# Altium integrated library Transistor-SMD_V2.IntLib: 415 symbols (part 1 of 2)
Pins are listed as number, name and electrical type; pins without a type are passive.

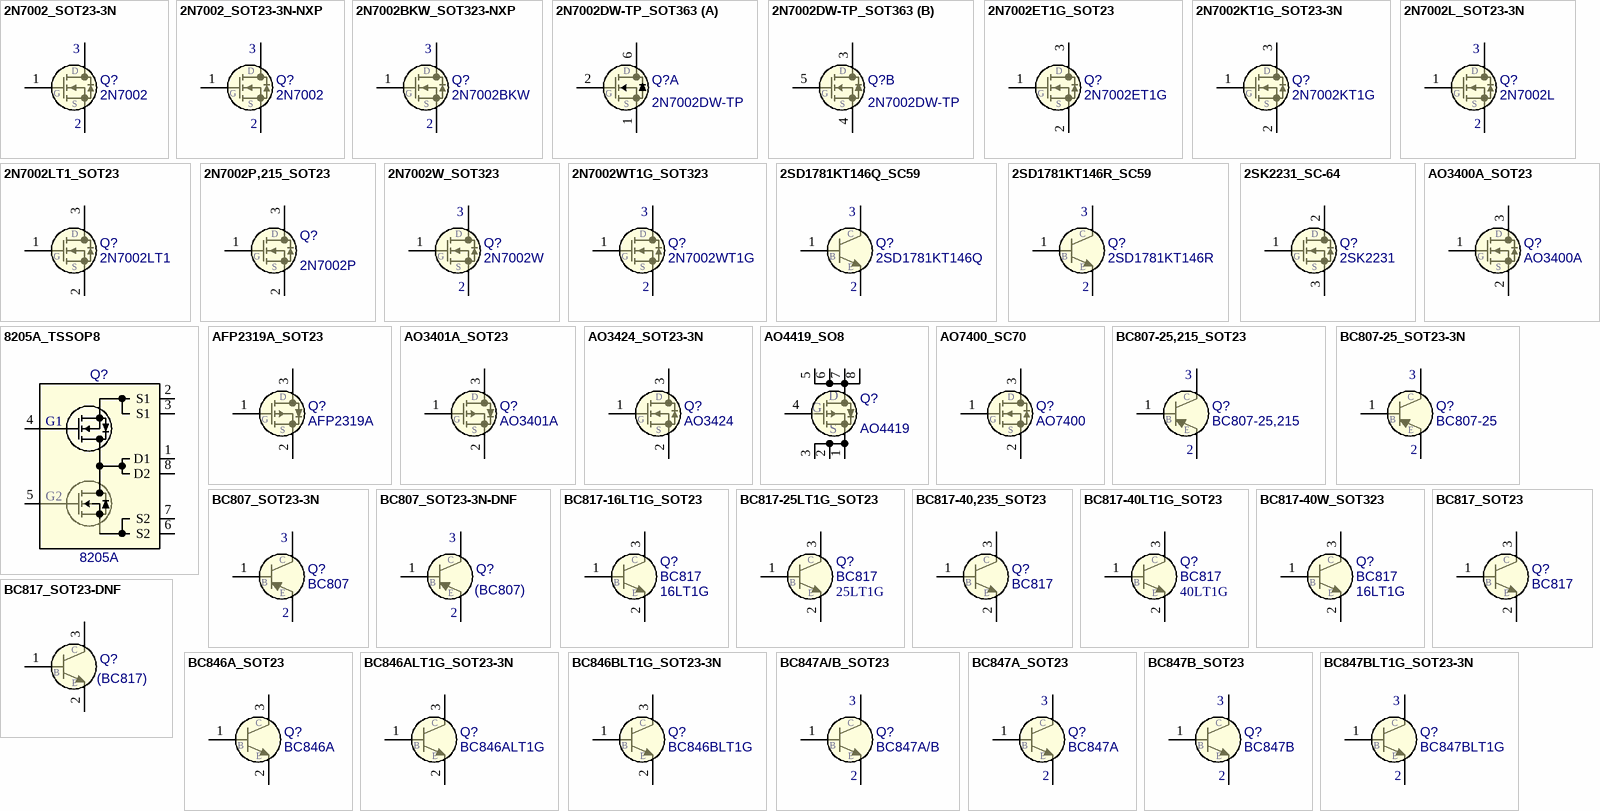
[diagram p0: symbols 2N7002_SOT23-3N to BC847BLT1G_SOT23-3N]

## 2N7002_SOT23-3N
designator Q?, comment 2N7002
FET N-Channel 60V 115mA; Manufacturer: On Semi; EDM-PN: FET12; Package: SOT23; Text2: *; Text1: *; Value: 2N7002; SAAB PN: *; DCE Part No: *; Part Number: 2N7002
footprint SOT23 (SOT23, 3-Leads, Body 3.0x1.4mm (max), Pitch 0.95mm, IPC Medium Density)
pins: 1 G, 2 S, 3 D

## 2N7002_SOT23-3N-NXP
designator Q?, comment Part Number: 2N7002  (hidden comment: 2N7002-NXP)
FET N-Channel 60V 300mA; Manufacturer: NXP; Value: 2N7002; Package: SOT23; EDM-PN: *; Text2: *; Text1: *; SAAB PN: *; DCE Part No: *
footprint SOT23 (SOT23, 3-Leads, Body 3.0x1.4mm (max), Pitch 0.95mm, IPC Medium Density)
pins: 1 G, 2 S, 3 D

## 2N7002BKW_SOT323-NXP
designator Q?, comment 2N7002BKW
FET N-Channel 60V 310mA; Manufacturer: NXP; Package: SOT323; EDM-PN: *; Text2: *; Text1: *; Value: 2N7002BKW; SAAB PN: *; DCE Part No: *; Part Number: 2N7002BKW
footprint SOT323 (SOT323 2.2x1.3mm)
pins: 1 G, 2 S, 3 D

## 2N7002DW-TP_SOT363
designator Q?, comment 2N7002DW-TP
FET Dual N-Channel 60V 115mA; Manufacturer: MCS; Package: SOT363-6; EDM-PN: *; Text2: *; Text1: *; Part Number: 2N7002DW-TP; SAAB PN: *; DCE Part No: *; Value: 2N7002DW-TP
footprint SOT363-6 (SOT363 1.35x2.2mm 6lead)
part A pins: 1 S1, 2 G1, 6 D1
part B pins: 3 D2, 4 S2, 5 G2
part A text: D; G; S
part B text: D; G; S

## 2N7002ET1G_SOT23
designator Q?, comment 2N7002ET1G
FET N-Channel 60V 260mA; Manufacturer: On Semi; Package: SOT23; EDM-PN: *; Text2: *; Text1: *; Value: 2N7002ET1G; SAAB PN: *; Part Number: 2N7002ET1G; DCE Part No: *
footprint SOT23 (SOT23, 3-Leads, Body 3.0x1.4mm (max), Pitch 0.95mm, IPC Medium Density)
pins: 1 G, 2 S, 3 D

## 2N7002KT1G_SOT23-3N
designator Q?, comment 2N7002KT1G
FET N-Channel 60V 380mA; Manufacturer: On Semi; DCE Part No: 8093; Package: SOT23; EDM-PN: *; Text2: *; Text1: *; Value: 2N7002KT1G; SAAB PN: *; Part Number: 2N7002KT1G
footprint SOT23 (SOT23, 3-Leads, Body 3.0x1.4mm (max), Pitch 0.95mm, IPC Medium Density)
pins: 1 G, 2 S, 3 D

## 2N7002L_SOT23-3N
designator Q?, comment 2N7002L
FET N-Channel 60V 115mA; Manufacturer: On Semi; Package: SOT23; EDM-PN: *; Text2: *; Text1: *; Value: 2N7002L; SAAB PN: *; DCE Part No: *; Part Number: 2N7002L
footprint SOT23 (SOT23, 3-Leads, Body 3.0x1.4mm (max), Pitch 0.95mm, IPC Medium Density)
pins: 1 G, 2 S, 3 D

## 2N7002LT1_SOT23
designator Q?, comment 2N7002LT1
FET N-Channel 60V 115mA; Manufacturer: On Semi; EDM-PN: FET12; Package: SOT23; Text2: *; Text1: *; Value: 2N7002LT1; SAAB PN: *; DCE Part No: *; Part Number: 2N7002LT1
footprint SOT23 (SOT23, 3-Leads, Body 3.0x1.4mm (max), Pitch 0.95mm, IPC Medium Density)
pins: 1 G, 2 S, 3 D

## 2N7002P,215_SOT23
designator Q?, comment value 2N7002P  (hidden comment: 2N7002P,215)
FET N-Channel 60V 115mA; Manufacturer: On Semi; Package: SOT23; EDM-PN: *; Text2: *; Text1: *; SAAB PN: *; DCE Part No: *; Part Number: 2N7002P,215
footprint SOT23 (SOT23, 3-Leads, Body 3.0x1.4mm (max), Pitch 0.95mm, IPC Medium Density)
pins: 1 G, 2 S, 3 D

## 2N7002W_SOT323
designator Q?, comment 2N7002W
FET N-Channel 60V 115mA; Manufacturer: Fairchild; DCE Part No: 8093; EDM-PN: FET114; Package: SOT323; Text2: *; Text1: *; Value: 2N7002W; SAAB PN: *; Part Number: 2N7002W
footprint SOT323 (SOT323 2.2x1.3mm)
pins: 1 G, 2 S, 3 D

## 2N7002WT1G_SOT323
designator Q?, comment 2N7002WT1G
FET N-Channel 60V 115mA; Manufacturer: On Semi; DCE Part No: 8093; EDM-PN: FET114; Package: SOT323; Text2: *; Text1: *; Value: 2N7002WT1G; SAAB PN: *; Part Number: 2N7002WT1G
footprint SOT323 (SOT323 2.2x1.3mm)
pins: 1 G, 2 S, 3 D

## 2SD1781KT146Q_SC59
designator Q?, comment 2SD1781KT146Q
Transistor NPN 32V 800mA; Manufacturer: Rohm; Package: SC59; EDM-PN: *; Text2: *; Text1: *; Value: 2SD1781KT146Q; SAAB PN: *; DCE Part No: *; Part Number: 2SD1781KT146Q
footprint SC59 (SC59 1.7x3.1mm)
pins: 1 B, 2 E, 3 C

## 2SD1781KT146R_SC59
designator Q?, comment 2SD1781KT146R
Transistor NPN 32V 800mA; Manufacturer: Rohm; Package: SC59; EDM-PN: *; Text2: *; Text1: *; Value: 2SD1781KT146R; SAAB PN: *; Part Number: 2SD1781KT146R; DCE Part No: *
footprint SC59 (SC59 1.7x3.1mm)
pins: 1 B, 2 E, 3 C

## 2SK2231_SC-64
designator Q?, comment 2SK2231
FET N-Channel 100V 100mA; Manufacturer: Toshiba; Package: SC64; EDM-PN: *; Text2: *; Text1: *; Value: 2SK2231; SAAB PN: *; DCE Part No: *; Part Number: 2SK2231
footprint SC64 (SC64 6.8x7.5mm)
pins: 1 G, 2 S, 3 D

## 8205A_TSSOP8
designator Q?, comment 8205A
FET Dual N-Channel 20V 5A; Manufacturer: Hottech; Package: TSSOP-8; EDM-PN: *; Text2: *; Text1: *; Value: 8205A; SAAB PN: *; Part Number: 8205A; DCE Part No: *
footprint TSSOP8-3.1x4.5 (TSSOP, 8-Leads, Body 3.1x4.5mm (max), Pitch 0.65mm, IPC Medium Density)
pins: 1 D1, 2 S1, 3 S1, 4 G1, 5 G2, 6 S2, 7 S2, 8 D2

## AFP2319A_SOT23
designator Q?, comment AFP2319A
FET P-Channel 40V 2.4A; Manufacturer: Alfa-MOS Tech; Package: SOT23; EDM-PN: *; Text2: *; Text1: *; Value: AFP2319A; SAAB PN: *; Part Number: AFP2319A; DCE Part No: *
footprint SOT23 (SOT23, 3-Leads, Body 3.0x1.4mm (max), Pitch 0.95mm, IPC Medium Density)
pins: 1 G, 2 S, 3 D

## AO3400A_SOT23
designator Q?, comment AO3400A
FET N-Channel 30V 5.7A; Manufacturer: Alpha & Omega; Package: SOT23; EDM-PN: *; Text2: *; Text1: *; Value: AO3400A; SAAB PN: *; Part Number: AO3400A; DCE Part No: *
footprint SOT23 (SOT23, 3-Leads, Body 3.0x1.4mm (max), Pitch 0.95mm, IPC Medium Density)
pins: 1 G, 2 S, 3 D

## AO3401A_SOT23
designator Q?, comment AO3401A
FET P-Channel 30V 4A; Manufacturer: Alpha & Omega; Package: SOT23; EDM-PN: *; Text2: *; Text1: *; Value: AO3401A; SAAB PN: *; Part Number: AO3401A; DCE Part No: *
footprint SOT23 (SOT23, 3-Leads, Body 3.0x1.4mm (max), Pitch 0.95mm, IPC Medium Density)
pins: 1 G, 2 S, 3 D

## AO3424_SOT23-3N
designator Q?, comment AO3424
FET N-Channel 30V 3.8A; Manufacturer: Alpha & Omega; Package: SOT23; EDM-PN: *; Text2: *; Text1: *; Value: AO3424; SAAB PN: *; Part Number: AO3424; DCE Part No: *
footprint SOT23 (SOT23, 3-Leads, Body 3.0x1.4mm (max), Pitch 0.95mm, IPC Medium Density)
pins: 1 G, 2 S, 3 D

## AO4419_SO8
designator Q?, comment AO4419
FET P-Channel 30V 9.7A; Manufacturer: Alpha & Omega; Package: SO8; EDM-PN: *; Text2: *; Text1: *; Value: AO4419; SAAB PN: *; Part Number: AO4419; DCE Part No: *
footprint SO8 (SOIC, 8-Leads, Body 5.0x4.0mm (max), Pitch 1.27mm, IPC Medium Density)
pins: 1 S, 2 S, 3 S, 4 G, 5 D, 6 D, 7 D, 8 D

## AO7400_SC70
designator Q?, comment AO7400
FET N-Channel 1A 20V; Manufacturer: Alpha & Omega; Package: SC70-3; EDM-PN: *; Text2: *; Text1: *; Value: AO7400; SAAB PN: *; DCE Part No: *; Part Number: AO7400
footprint SC70-3 (SC70-3 2.1x1.24mm)
pins: 1 G, 2 S, 3 D

## BC807-25,215_SOT23
designator Q?, comment BC807-25,215
Transistor PNP General Purpose 45V 500mA; Manufacturer: Nexperia; Package: SOT23; EDM-PN: *; Text2: *; Text1: *; Value: BC807-25,215; SAAB PN: *; DCE Part No: *; Part Number: BC807-25,215
footprint SOT23 (SOT23, 3-Leads, Body 3.0x1.4mm (max), Pitch 0.95mm, IPC Medium Density)
pins: 1 B, 2 E, 3 C

## BC807-25_SOT23-3N
designator Q?, comment BC807-25
Transistor PNP General Purpose; Manufacturer: NXP; Package: SOT23; EDM-PN: *; Text2: *; Text1: *; Value: BC807-25; SAAB PN: *; Part Number: BC807-25; DCE Part No: *
footprint SOT23 (SOT23, 3-Leads, Body 3.0x1.4mm (max), Pitch 0.95mm, IPC Medium Density)
pins: 1 B, 2 E, 3 C

## BC807_SOT23-3N
designator Q?, comment BC807
Transistor PNP General Purpose; Manufacturer: NXP; EDM-PN: TRN2; Package: SOT23; Text2: *; Text1: *; Value: BC807; SAAB PN: *; Part Number: BC807; DCE Part No: *
footprint SOT23 (SOT23, 3-Leads, Body 3.0x1.4mm (max), Pitch 0.95mm, IPC Medium Density)
pins: 1 B, 2 E, 3 C

## BC807_SOT23-3N-DNF
designator Q?, comment value (BC807)  (hidden comment: BC807-DNF)
Transistor PNP General Purpose - Do not Fit; Manufacturer: NXP; Part Number: DNF - BC807; EDM-PN: TRN2; Package: SOT23; Text2: *; Text1: *; SAAB PN: *; DCE Part No: *
footprint SOT23 (SOT23, 3-Leads, Body 3.0x1.4mm (max), Pitch 0.95mm, IPC Medium Density)
pins: 1 B, 2 E, 3 C

## BC817-16LT1G_SOT23
designator Q?, comment Text2: 16LT1G  Text1: BC817  (hidden comment: BC817-16LT1G)
Transistor NPN General Purpose 45V 500mA; Manufacturer: On Semi; DCE Part No: 7392; Package: SOT23; EDM-PN: *; Value: BC817-16LT1G; SAAB PN: *; Part Number: BC817-16LT1G
footprint SOT23 (SOT23, 3-Leads, Body 3.0x1.4mm (max), Pitch 0.95mm, IPC Medium Density)
pins: 1 B, 2 E, 3 C

## BC817-25LT1G_SOT23
designator Q?, comment Text2: 25LT1G  Text1: BC817  (hidden comment: BC817-25LT1G)
Transistor NPN General Purpose 45V 500mA; Manufacturer: On Semi; EDM-PN: TRN136; Package: SOT23; Value: BC817-25LT1G; SAAB PN: *; Part Number: BC817-25LT1G; DCE Part No: *
footprint SOT23 (SOT23, 3-Leads, Body 3.0x1.4mm (max), Pitch 0.95mm, IPC Medium Density)
pins: 1 B, 2 E, 3 C

## BC817-40,235_SOT23
designator Q?, comment Part Number: BC817  (hidden comment: BC817-40,235)
Transistor NPN General Purpose 45V 500mA; Manufacturer: Nexperia; EDM-PN: TRN12; Package: SOT23; Text2: *; Text1: *; Value: BC817-40,235; SAAB PN: *; DCE Part No: *
footprint SOT23 (SOT23, 3-Leads, Body 3.0x1.4mm (max), Pitch 0.95mm, IPC Medium Density)
pins: 1 B, 2 E, 3 C

## BC817-40LT1G_SOT23
designator Q?, comment Text2: 40LT1G  Text1: BC817  (hidden comment: BC817-40LT1G)
Transistor NPN General Purpose 45V 500mA; Manufacturer: On Semi; Package: SOT23; EDM-PN: *; Value: BC817-40LT1G; SAAB PN: *; Part Number: BC817-40LT1G; DCE Part No: *
footprint SOT23 (SOT23, 3-Leads, Body 3.0x1.4mm (max), Pitch 0.95mm, IPC Medium Density)
pins: 1 B, 2 E, 3 C

## BC817-40W_SOT323
designator Q?, comment Text2: 16LT1G  Text1: BC817  (hidden comment: BC817-40W)
Transistor NPN General Purpose 45V 500mA; Manufacturer: Varius; DCE Part No: 7292; Package: SOT323; EDM-PN: *; Value: BC817-40W; SAAB PN: *; Part Number: BC817-40W
footprint SOT323 (SOT323 2.2x1.3mm)
pins: 1 B, 2 E, 3 C

## BC817_SOT23
designator Q?, comment BC817
Transistor NPN General Purpose 45V 500mA; Manufacturer: Various; EDM-PN: TRN12; Package: SOT23; Text2: *; Text1: *; Value: BC817; SAAB PN: *; Part Number: BC817; DCE Part No: *
footprint SOT23 (SOT23, 3-Leads, Body 3.0x1.4mm (max), Pitch 0.95mm, IPC Medium Density)
pins: 1 B, 2 E, 3 C

## BC817_SOT23-DNF
designator Q?, comment value (BC817)  (hidden comment: BC817-DNF)
Transistor NPN General Purpose - Do not Fit; Manufacturer: Various; Part Number: DNF - BC817; EDM-PN: TRN12; Package: SOT23; Text2: *; Text1: *; SAAB PN: *; DCE Part No: *
footprint SOT23 (SOT23, 3-Leads, Body 3.0x1.4mm (max), Pitch 0.95mm, IPC Medium Density)
pins: 1 B, 2 E, 3 C

## BC846A_SOT23
designator Q?, comment BC846A
Transistor NPN Switching; Manufacturer: Various; Package: SOT23; EDM-PN: *; Text2: *; Text1: *; Value: BC846A; SAAB PN: *; Part Number: BC846A; DCE Part No: *
footprint SOT23 (SOT23, 3-Leads, Body 3.0x1.4mm (max), Pitch 0.95mm, IPC Medium Density)
pins: 1 B, 2 E, 3 C

## BC846ALT1G_SOT23-3N
designator Q?, comment BC846ALT1G
Transistor NPN Switching 65V 100mA; Manufacturer: On Semi; Reutech PN: 5961-NP-0047; Package: SOT23; EDM-PN: *; Text2: *; Text1: *; Value: BC846ALT1G; SAAB PN: *; Part Number: BC846ALT1G; DCE Part No: *
footprint SOT23 (SOT23, 3-Leads, Body 3.0x1.4mm (max), Pitch 0.95mm, IPC Medium Density)
pins: 1 B, 2 E, 3 C

## BC846BLT1G_SOT23-3N
designator Q?, comment BC846BLT1G
Transistor NPN Switching 65V 100mA; Manufacturer: On Semi; EDM-PN: TRN149; Package: SOT23; Text2: *; Text1: *; Value: BC846BLT1G; SAAB PN: *; Part Number: BC846BLT1G; DCE Part No: *
footprint SOT23 (SOT23, 3-Leads, Body 3.0x1.4mm (max), Pitch 0.95mm, IPC Medium Density)
pins: 1 B, 2 E, 3 C

## BC847A/B_SOT23
designator Q?, comment BC847A/B
Transistor NPN Switching; Manufacturer: Various; Package: SOT23; EDM-PN: *; Text2: *; Text1: *; Value: BC847A/B; SAAB PN: *; Part Number: BC847A/B; DCE Part No: *
footprint SOT23 (SOT23, 3-Leads, Body 3.0x1.4mm (max), Pitch 0.95mm, IPC Medium Density)
pins: 1 B, 2 E, 3 C

## BC847A_SOT23
designator Q?, comment BC847A
Transistor NPN Switching; Manufacturer: Various; Package: SOT23; EDM-PN: *; Text2: *; Text1: *; Value: BC847A; SAAB PN: *; Part Number: BC847A; DCE Part No: *
footprint SOT23 (SOT23, 3-Leads, Body 3.0x1.4mm (max), Pitch 0.95mm, IPC Medium Density)
pins: 1 B, 2 E, 3 C

## BC847B_SOT23
designator Q?, comment BC847B
Transistor NPN Switching; Manufacturer: Various; Package: SOT23; EDM-PN: *; Text2: *; Text1: *; Value: BC847B; Part Number: BC847B; SAAB PN: *; DCE Part No: *
footprint SOT23 (SOT23, 3-Leads, Body 3.0x1.4mm (max), Pitch 0.95mm, IPC Medium Density)
pins: 1 B, 2 E, 3 C

## BC847BLT1G_SOT23-3N
designator Q?, comment BC847BLT1G
Transistor NPN Switching 45V 100mA; Manufacturer: On Semi; Package: SOT23; EDM-PN: *; Text2: *; Text1: *; Value: BC847BLT1G; Part Number: BC847BLT1G; SAAB PN: *; DCE Part No: *
footprint SOT23 (SOT23, 3-Leads, Body 3.0x1.4mm (max), Pitch 0.95mm, IPC Medium Density)
pins: 1 B, 2 E, 3 C

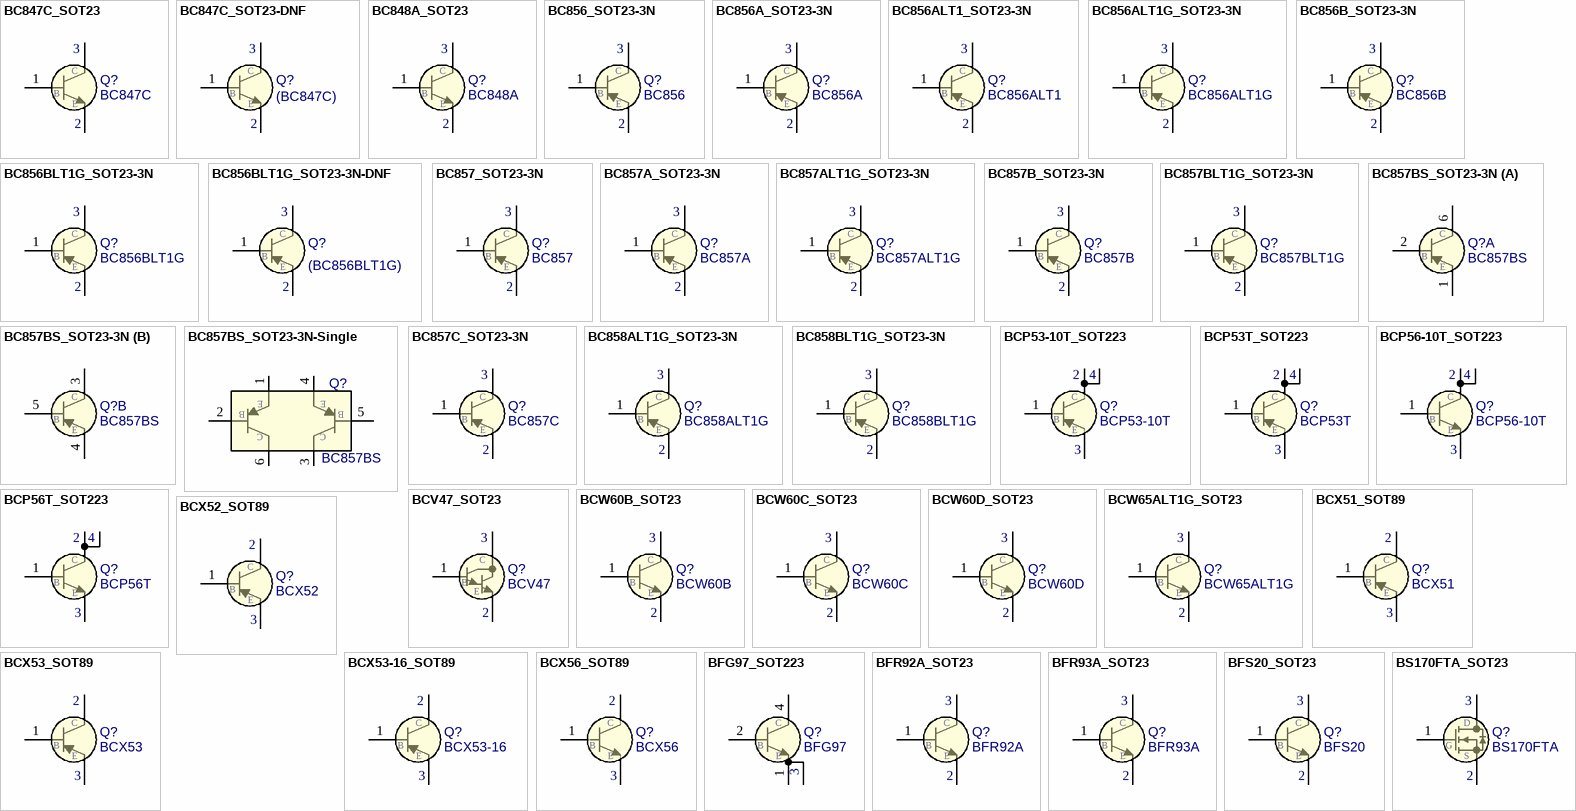
[diagram p1: symbols BC847C_SOT23 to BS170FTA_SOT23]

## BC847C_SOT23
designator Q?, comment BC847C
Transistor NPN Switching; Manufacturer: Various; EDM-PN: TRN100; Package: SOT23; Text2: *; Text1: *; Value: BC847C; SAAB PN: *; Part Number: BC847C; DCE Part No: *
footprint SOT23 (SOT23, 3-Leads, Body 3.0x1.4mm (max), Pitch 0.95mm, IPC Medium Density)
pins: 1 B, 2 E, 3 C

## BC847C_SOT23-DNF
designator Q?, comment value (BC847C)  (hidden comment: BC847C)
Transistor NPN Switching - Do not Fit; Manufacturer: Various; Part Number: DNF - BC847C; EDM-PN: TRN100; Package: SOT23; Text2: *; Text1: *; SAAB PN: *; DCE Part No: *
footprint SOT23 (SOT23, 3-Leads, Body 3.0x1.4mm (max), Pitch 0.95mm, IPC Medium Density)
pins: 1 B, 2 E, 3 C

## BC848A_SOT23
designator Q?, comment BC848A
Transistor NPN Switching; Manufacturer: Various; Package: SOT23; EDM-PN: *; Text2: *; Text1: *; Value: BC848A; SAAB PN: *; Part Number: BC848A; DCE Part No: *
footprint SOT23 (SOT23, 3-Leads, Body 3.0x1.4mm (max), Pitch 0.95mm, IPC Medium Density)
pins: 1 B, 2 E, 3 C

## BC856_SOT23-3N
designator Q?, comment BC856
Transistor PNP General Purpose Amplifier; Manufacturer: NXP; Package: SOT23; EDM-PN: *; Text2: *; Text1: *; Value: BC856; SAAB PN: *; Part Number: BC856; DCE Part No: *
footprint SOT23 (SOT23, 3-Leads, Body 3.0x1.4mm (max), Pitch 0.95mm, IPC Medium Density)
pins: 1 B, 2 E, 3 C

## BC856A_SOT23-3N
designator Q?, comment BC856A
Transistor PNP General Purpose; Manufacturer: NXP; Package: SOT23; EDM-PN: *; Text2: *; Text1: *; Value: BC856A; SAAB PN: *; Part Number: BC856A; DCE Part No: *
footprint SOT23 (SOT23, 3-Leads, Body 3.0x1.4mm (max), Pitch 0.95mm, IPC Medium Density)
pins: 1 B, 2 E, 3 C

## BC856ALT1_SOT23-3N
designator Q?, comment BC856ALT1
Transistor PNP General Purpose; Manufacturer: On Semi; Reutech PN: 5961-PN-0023; Package: SOT23; EDM-PN: *; Text2: *; Text1: *; Value: BC856ALT1; SAAB PN: *; Part Number: BC856ALT1; DCE Part No: *
footprint SOT23 (SOT23, 3-Leads, Body 3.0x1.4mm (max), Pitch 0.95mm, IPC Medium Density)
pins: 1 B, 2 E, 3 C

## BC856ALT1G_SOT23-3N
designator Q?, comment BC856ALT1G
Transistor PNP General Purpose 65V 100mA; Manufacturer: On Semi; Reutech PN: 5961-PN-0023; Package: SOT23; EDM-PN: *; Text2: *; Text1: *; Value: BC856ALT1G; SAAB PN: *; Part Number: BC856ALT1G; DCE Part No: *
footprint SOT23 (SOT23, 3-Leads, Body 3.0x1.4mm (max), Pitch 0.95mm, IPC Medium Density)
pins: 1 B, 2 E, 3 C

## BC856B_SOT23-3N
designator Q?, comment BC856B
Transistor PNP General Purpose Amplifier; Manufacturer: NXP; Package: SOT23; EDM-PN: *; Text2: *; Text1: *; Value: BC856B; Part Number: BC856B; SAAB PN: *; DCE Part No: *
footprint SOT23 (SOT23, 3-Leads, Body 3.0x1.4mm (max), Pitch 0.95mm, IPC Medium Density)
pins: 1 B, 2 E, 3 C

## BC856BLT1G_SOT23-3N
designator Q?, comment BC856BLT1G
Transistor PNP General Purpose 65V 100mA; Manufacturer: On Semi; EDM-PN: TRN105; Package: SOT23; Text2: *; Text1: *; Value: BC856BLT1G; SAAB PN: *; Part Number: BC856BLT1G; DCE Part No: *
footprint SOT23 (SOT23, 3-Leads, Body 3.0x1.4mm (max), Pitch 0.95mm, IPC Medium Density)
pins: 1 B, 2 E, 3 C

## BC856BLT1G_SOT23-3N-DNF
designator Q?, comment value (BC856BLT1G)  (hidden comment: BC856BLT1G-DNF)
Transistor PNP General Purpose 65V 100mA - Do not Fit; Manufacturer: On Semi; Part Number: DNF - BC856BLT1G; EDM-PN: TRN105; Package: SOT23; Text2: *; Text1: *; SAAB PN: *; DCE Part No: *
footprint SOT23 (SOT23, 3-Leads, Body 3.0x1.4mm (max), Pitch 0.95mm, IPC Medium Density)
pins: 1 B, 2 E, 3 C

## BC857_SOT23-3N
designator Q?, comment BC857
Transistor PNP General Purpose Amplifier; Manufacturer: NXP; Package: SOT23; EDM-PN: *; Text2: *; Text1: *; Value: BC857; Part Number: BC857; SAAB PN: *; DCE Part No: *
footprint SOT23 (SOT23, 3-Leads, Body 3.0x1.4mm (max), Pitch 0.95mm, IPC Medium Density)
pins: 1 B, 2 E, 3 C

## BC857A_SOT23-3N
designator Q?, comment BC857A
Transistor PNP General Purpose Amplifier; Manufacturer: NXP; Package: SOT23; EDM-PN: *; Text2: *; Text1: *; Value: BC857A; Part Number: BC857A; SAAB PN: *; DCE Part No: *
footprint SOT23 (SOT23, 3-Leads, Body 3.0x1.4mm (max), Pitch 0.95mm, IPC Medium Density)
pins: 1 B, 2 E, 3 C

## BC857ALT1G_SOT23-3N
designator Q?, comment BC857ALT1G
Transistor PNP General Purpose 45V 100mA; Manufacturer: On Semi; Package: SOT23; EDM-PN: *; Text2: *; Text1: *; Value: BC857ALT1G; SAAB PN: *; Part Number: BC857ALT1G; DCE Part No: *
footprint SOT23 (SOT23, 3-Leads, Body 3.0x1.4mm (max), Pitch 0.95mm, IPC Medium Density)
pins: 1 B, 2 E, 3 C

## BC857B_SOT23-3N
designator Q?, comment BC857B
Transistor PNP General Purpose Amplifier; Manufacturer: NXP; Package: SOT23; EDM-PN: *; Text2: *; Text1: *; Value: BC857B; SAAB PN: *; Part Number: BC857B; DCE Part No: *
footprint SOT23 (SOT23, 3-Leads, Body 3.0x1.4mm (max), Pitch 0.95mm, IPC Medium Density)
pins: 1 B, 2 E, 3 C

## BC857BLT1G_SOT23-3N
designator Q?, comment BC857BLT1G
Transistor PNP General Purpose 45V 100mA; Manufacturer: On Semi; Package: SOT23; EDM-PN: *; Text2: *; Text1: *; Value: BC857BLT1G; SAAB PN: *; Part Number: BC857BLT1G; DCE Part No: *
footprint SOT23 (SOT23, 3-Leads, Body 3.0x1.4mm (max), Pitch 0.95mm, IPC Medium Density)
pins: 1 B, 2 E, 3 C

## BC857BS_SOT23-3N
designator Q?, comment BC857BS
Transistor Dual PNP General Purpose; Manufacturer: NXP; Package: SOT363-6; EDM-PN: *; Text2: *; Text1: *; Value: BC857BS; SAAB PN: *; Part Number: BC857BS; DCE Part No: *
footprint SOT363-6 (SOT363 1.35x2.2mm 6lead)
part A pins: 1 E, 2 B, 6 C
part B pins: 3 C, 4 E, 5 B

## BC857BS_SOT23-3N-Single
designator Q?, comment BC857BS
Transistor Dual PNP General Purpose; Manufacturer: NXP; Package: SOT363-6; EDM-PN: *; Text2: *; Text1: *; Value: BC857BS; SAAB PN: *; DCE Part No: *; Part Number: BC857BS
footprint SOT363-6 (SOT363 1.35x2.2mm 6lead)
pins: 1 E, 2 B, 3 C, 4 E, 5 B, 6 C

## BC857C_SOT23-3N
designator Q?, comment BC857C
Transistor PNP General Purpose Amplifier; Manufacturer: NXP; EDM-PN: TRN85; Package: SOT23; Text2: *; Text1: *; Value: BC857C; SAAB PN: *; Part Number: BC857C; DCE Part No: *
footprint SOT23 (SOT23, 3-Leads, Body 3.0x1.4mm (max), Pitch 0.95mm, IPC Medium Density)
pins: 1 B, 2 E, 3 C

## BC858ALT1G_SOT23-3N
designator Q?, comment BC858ALT1G
Transistor PNP General Purpose 30V 100mA; Manufacturer: On Semi; Package: SOT23; EDM-PN: *; Text2: *; Text1: *; Value: BC858ALT1G; SAAB PN: *; Part Number: BC858ALT1G; DCE Part No: *
footprint SOT23 (SOT23, 3-Leads, Body 3.0x1.4mm (max), Pitch 0.95mm, IPC Medium Density)
pins: 1 B, 2 E, 3 C

## BC858BLT1G_SOT23-3N
designator Q?, comment BC858BLT1G
Transistor PNP General Purpose 30V 100mA; Manufacturer: On Semi; Package: SOT23; EDM-PN: *; Text2: *; Text1: *; Value: BC858BLT1G; Part Number: BC858BLT1G; SAAB PN: *; DCE Part No: *
footprint SOT23 (SOT23, 3-Leads, Body 3.0x1.4mm (max), Pitch 0.95mm, IPC Medium Density)
pins: 1 B, 2 E, 3 C

## BCP53-10T_SOT223
designator Q?, comment BCP53-10T
Transistor PNP Medium Power 80V 1A; Manufacturer: Nexperia; Reutech PN: 5961-CM-0092; Package: SOT223; Text2: *; Text1: *; Value: BCP53-10T; SAAB PN: *; Part Number: BCP53-10T; DCE Part No: *
footprint SOT223 (SOT223, 4-Leads, Body 6.7x7.3mm (max), Pitch 2.30mm, IPC Medium Density)
pins: 1 G, 2 D, 3 S, 4 D
text: C; B; E

## BCP53T_SOT223
designator Q?, comment BCP53T
Transistor PNP Medium Power 80V 1A; Manufacturer: Nexperia; Package: SOT223; Text2: *; Text1: *; Value: BCP53T; Reutech PN: *; SAAB PN: *; Part Number: BCP53T; DCE Part No: *
footprint SOT223 (SOT223, 4-Leads, Body 6.7x7.3mm (max), Pitch 2.30mm, IPC Medium Density)
pins: 1 G, 2 D, 3 S, 4 D
text: C; B; E

## BCP56-10T_SOT223
designator Q?, comment BCP56-10T
Transistor NPN Medium Power 80V 1A; Manufacturer: Nexperia; Reutech PN: 5961-CM-0093; Package: SOT223; EDM-PN: *; Text2: *; Text1: *; Value: BCP56-10T; SAAB PN: *; Part Number: BCP56-10T; DCE Part No: *
footprint SOT223 (SOT223, 4-Leads, Body 6.7x7.3mm (max), Pitch 2.30mm, IPC Medium Density)
pins: 1 B, 2 C, 3 E, 4 C

## BCP56T_SOT223
designator Q?, comment BCP56T
Transistor NPN Medium Power 80V 1A; Manufacturer: Nexperia; Package: SOT223; EDM-PN: *; Text2: *; Text1: *; Value: BCP56T; Reutech PN: *; SAAB PN: *; Part Number: BCP56T; DCE Part No: *
footprint SOT223 (SOT223, 4-Leads, Body 6.7x7.3mm (max), Pitch 2.30mm, IPC Medium Density)
pins: 1 B, 2 C, 3 E, 4 C

## BCV47_SOT23
designator Q?, comment BCV47
Transistor NPN Darlington; Manufacturer: NXP; Package: SOT23; EDM-PN: *; Text2: *; Text1: *; Value: BCV47; SAAB PN: *; Part Number: BCV47; DCE Part No: *
footprint SOT23 (SOT23, 3-Leads, Body 3.0x1.4mm (max), Pitch 0.95mm, IPC Medium Density)
pins: 1 B, 2 E, 3 C

## BCW60B_SOT23
designator Q?, comment BCW60B
Transistor NPN Switching; Manufacturer: NXP; Package: SOT23; EDM-PN: *; Text2: *; Text1: *; Value: BCW60B; Part Number: BCW60B; SAAB PN: *; DCE Part No: *
footprint SOT23 (SOT23, 3-Leads, Body 3.0x1.4mm (max), Pitch 0.95mm, IPC Medium Density)
pins: 1 B, 2 E, 3 C

## BCW60C_SOT23
designator Q?, comment BCW60C
Transistor NPN Switching; Manufacturer: NXP; Package: SOT23; EDM-PN: *; Text2: *; Text1: *; Value: BCW60C; SAAB PN: *; Part Number: BCW60C; DCE Part No: *
footprint SOT23 (SOT23, 3-Leads, Body 3.0x1.4mm (max), Pitch 0.95mm, IPC Medium Density)
pins: 1 B, 2 E, 3 C

## BCW60D_SOT23
designator Q?, comment BCW60D
Transistor NPN Switching; Manufacturer: NXP; Package: SOT23; EDM-PN: *; Text2: *; Text1: *; Value: BCW60D; Part Number: BCW60D; SAAB PN: *; DCE Part No: *
footprint SOT23 (SOT23, 3-Leads, Body 3.0x1.4mm (max), Pitch 0.95mm, IPC Medium Density)
pins: 1 B, 2 E, 3 C

## BCW65ALT1G_SOT23
designator Q?, comment BCW65ALT1G
Transistor NPN Switching 32V 800mA; Manufacturer: On Semi; Package: SOT23; EDM-PN: *; Text2: *; Text1: *; Value: BCW65ALT1G; Part Number: BCW65ALT1G; SAAB PN: *; DCE Part No: *
footprint SOT23 (SOT23, 3-Leads, Body 3.0x1.4mm (max), Pitch 0.95mm, IPC Medium Density)
pins: 1 B, 2 E, 3 C

## BCX51_SOT89
designator Q?, comment BCX51
Transistor PNP Medium Power; Manufacturer: Philips; Package: SOT89; EDM-PN: *; Text2: *; Text1: *; Value: BCX51; Part Number: BCX51; SAAB PN: *; DCE Part No: *
footprint SOT89 (SOT89 4.5x2.45mm)
pins: 1 B, 2 C, 3 E

## BCX52_SOT89
designator Q?, comment BCX52
Transistor PNP Medium Power; Manufacturer: Philips; Package: SOT89; EDM-PN: *; Text2: *; Text1: *; Value: BCX52; SAAB PN: *; Part Number: BCX52; DCE Part No: *
footprint SOT89 (SOT89 4.5x2.45mm)
pins: 1 B, 2 C, 3 E

## BCX53-16_SOT89
designator Q?, comment BCX53-16
Transistor PNP Medium Power; Manufacturer: NXP; Package: SOT89; EDM-PN: *; Text2: *; Text1: *; Value: BCX53-16; Part Number: BCX53-16; SAAB PN: *; DCE Part No: *
footprint SOT89 (SOT89 4.5x2.45mm)
pins: 1 B, 2 C, 3 E

## BCX53_SOT89
designator Q?, comment BCX53
Transistor PNP Medium Power; Manufacturer: Philips; Package: SOT89; EDM-PN: *; Text2: *; Text1: *; Value: BCX53; Part Number: BCX53; SAAB PN: *; DCE Part No: *
footprint SOT89 (SOT89 4.5x2.45mm)
pins: 1 B, 2 C, 3 E

## BCX56_SOT89
designator Q?, comment BCX56
Transistor NPN Medium Power 80V 1Amp; Manufacturer: NXP; EDM-PN: TRN127; Package: SOT89; Text2: *; Text1: *; Value: BCX56; SAAB PN: *; Part Number: BCX56; DCE Part No: *
footprint SOT89 (SOT89 4.5x2.45mm)
pins: 1 B, 2 C, 3 E

## BFG97_SOT223
designator Q?, comment BFG97
Transistor NPN 5 GHz Wideband; Manufacturer: NXP; Package: SOT223; EDM-PN: *; Text2: *; Text1: *; Value: BFG97; SAAB PN: *; Part Number: BFG97; DCE Part No: *
footprint SOT223 (SOT223, 4-Leads, Body 6.7x7.3mm (max), Pitch 2.30mm, IPC Medium Density)
pins: 1 E, 2 B, 3 E, 4 C

## BFR92A_SOT23
designator Q?, comment BFR92A
Transistor NPN 5 GHz Wideband; Manufacturer: NXP; Package: SOT23; EDM-PN: *; Text2: *; Text1: *; Value: BFR92A; SAAB PN: *; Part Number: BFR92A; DCE Part No: *
footprint SOT23 (SOT23, 3-Leads, Body 3.0x1.4mm (max), Pitch 0.95mm, IPC Medium Density)
pins: 1 B, 2 E, 3 C

## BFR93A_SOT23
designator Q?, comment BFR93A
Transistor NPN 5 GHz Wideband; Manufacturer: NXP; Package: SOT23; EDM-PN: *; Text2: *; Text1: *; Value: BFR93A; SAAB PN: *; Part Number: BFR93A; DCE Part No: *
footprint SOT23 (SOT23, 3-Leads, Body 3.0x1.4mm (max), Pitch 0.95mm, IPC Medium Density)
pins: 1 B, 2 E, 3 C

## BFS20_SOT23
designator Q?, comment BFS20
Transistor NPN Medium Freqency; Manufacturer: NXP; Package: SOT23; EDM-PN: *; Text2: *; Text1: *; Value: BFS20; SAAB PN: *; Part Number: BFS20; DCE Part No: *
footprint SOT23 (SOT23, 3-Leads, Body 3.0x1.4mm (max), Pitch 0.95mm, IPC Medium Density)
pins: 1 B, 2 E, 3 C

## BS170FTA_SOT23
designator Q?, comment BS170FTA
FET N-Channel 60V 150mA; Manufacturer: Diodes; Package: SOT23; EDM-PN: *; Text2: *; Text1: *; Value: BS170FTA; SAAB PN: *; Part Number: BS170FTA; DCE Part No: *
footprint SOT23 (SOT23, 3-Leads, Body 3.0x1.4mm (max), Pitch 0.95mm, IPC Medium Density)
pins: 1 G, 2 S, 3 D

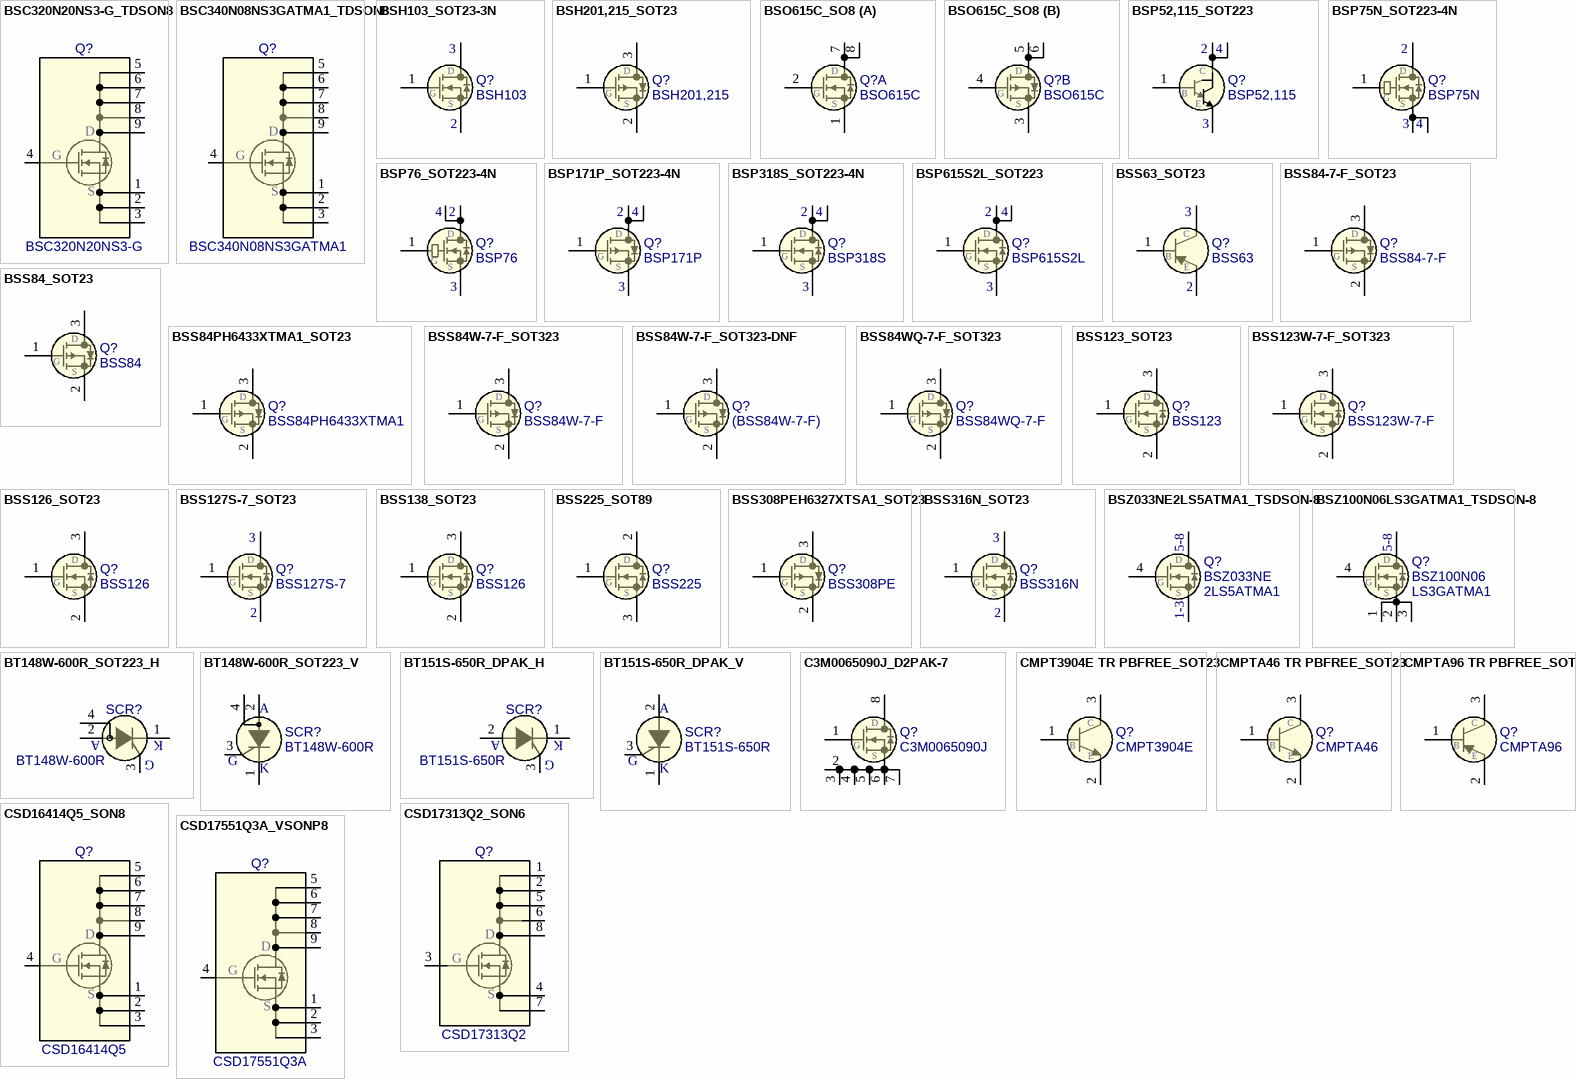
[diagram p2: symbols BSC320N20NS3-G_TDSON8 to CSD17551Q3A_VSONP8]

## BSC320N20NS3-G_TDSON8
designator Q?, comment BSC320N20NS3-G
FET N-Channel 200V 36A; Manufacturer: Infineon; Package: PG-TDSON-8; EDM-PN: *; Text2: *; Text1: *; Value: BSC320N20NS3-G; SAAB PN: *; Part Number: BSC320N20NS3-G; DCE Part No: *
footprint PG-TDSON-8 (PG-TDSON-8 6.1x5.1mm)
pins: 1 S, 2 S, 3 S, 4 G, 5 D, 6 D, 7 D, 8 D, 9 D

## BSC340N08NS3GATMA1_TDSON8
designator Q?, comment BSC340N08NS3GATMA1
FET N-Channel 80V 7A; Manufacturer: Infineon; Package: PG-TDSON-8; EDM-PN: *; Text2: *; Text1: *; Value: BSC340N08NS3GATMA1; SAAB PN: *; Part Number: BSC340N08NS3GATMA1; DCE Part No: *
footprint PG-TDSON-8 (PG-TDSON-8 6.1x5.1mm)
pins: 1 S, 2 S, 3 S, 4 G, 5 D, 6 D, 7 D, 8 D, 9 D

## BSH103_SOT23-3N
designator Q?, comment BSH103
FET N-Channel 30V 850mA; Manufacturer: Philips; Package: SOT23; EDM-PN: *; Text2: *; Text1: *; Value: BSH103; SAAB PN: *; Part Number: BSH103; DCE Part No: *
footprint SOT23 (SOT23, 3-Leads, Body 3.0x1.4mm (max), Pitch 0.95mm, IPC Medium Density)
pins: 1 G, 2 S, 3 D

## BSH201,215_SOT23
designator Q?, comment BSH201,215
FET P-Channel 60V 600mA; Manufacturer: NXP; Package: SOT23; EDM-PN: *; Text2: *; Text1: *; Value: BSH201,215; Part Number: BSH201,215; SAAB PN: *; DCE Part No: *
footprint SOT23 (SOT23, 3-Leads, Body 3.0x1.4mm (max), Pitch 0.95mm, IPC Medium Density)
pins: 1 G, 2 S, 3 D

## BSO615C_SO8
designator Q?, comment BSO615C
FET Dual N & P-Channel; Manufacturer: Infineon; Package: SO8; EDM-PN: *; Text2: *; Text1: *; Value: BSO615C; SAAB PN: *; Part Number: BSO615C; DCE Part No: *
footprint SO8 (SOIC, 8-Leads, Body 5.0x4.0mm (max), Pitch 1.27mm, IPC Medium Density)
part A pins: 1 S1, 2 G1, 7 D1, 8 D2
part B pins: 3 S2, 4 G2, 5 D2, 6 D2
part A text: D; G; S
part B text: D; G; S

## BSP52,115_SOT223
designator Q?, comment BSP52,115
Transistor NPN Darlington 80V 1A AEC-Q101; Manufacturer: Nexperia; Reutech PN: 5961-NP-0061; Package: SOT223; EDM-PN: *; Text2: *; Text1: *; Value: BSP52,115; SAAB PN: *; Part Number: BSP52,115; DCE Part No: *
footprint SOT223 (SOT223, 4-Leads, Body 6.7x7.3mm (max), Pitch 2.30mm, IPC Medium Density)
pins: 1 B, 2 C, 3 E, 4 C

## BSP75N_SOT223-4N
designator Q?, comment BSP75N
FET Lowside Power Switch; Manufacturer: Infineon; Package: SOT223; EDM-PN: *; Text2: *; Text1: *; Value: BSP75N; SAAB PN: *; Part Number: BSP75N; DCE Part No: *
footprint SOT223 (SOT223, 4-Leads, Body 6.7x7.3mm (max), Pitch 2.30mm, IPC Medium Density)
pins: 1 G, 2 D, 3 S, 4 D

## BSP76_SOT223-4N
designator Q?, comment BSP76
FET Lowside Power Switch; Manufacturer: Infineon; Package: SOT223; EDM-PN: *; Text2: *; Text1: *; Value: BSP76; SAAB PN: *; Part Number: BSP76; DCE Part No: *
footprint SOT223 (SOT223, 4-Leads, Body 6.7x7.3mm (max), Pitch 2.30mm, IPC Medium Density)
pins: 1 G, 2 D, 3 S, 4 D

## BSP171P_SOT223-4N
designator Q?, comment BSP171P
FET P-Channel SIPMOS Small Signal; Manufacturer: Infineon; Package: SOT223; EDM-PN: *; Text2: *; Text1: *; Value: BSP171P; SAAB PN: *; Part Number: BSP171P; DCE Part No: *
footprint SOT223 (SOT223, 4-Leads, Body 6.7x7.3mm (max), Pitch 2.30mm, IPC Medium Density)
pins: 1 G, 2 D, 3 S, 4 D

## BSP318S_SOT223-4N
designator Q?, comment BSP318S
FET N-Channel SIPMOS Small Signal; Manufacturer: Infineon; Package: SOT223; EDM-PN: *; Text2: *; Text1: *; Value: BSP318S; SAAB PN: *; Part Number: BSP318S; DCE Part No: *
footprint SOT223 (SOT223, 4-Leads, Body 6.7x7.3mm (max), Pitch 2.30mm, IPC Medium Density)
pins: 1 G, 2 D, 3 S, 4 D

## BSP615S2L_SOT223
designator Q?, comment BSP615S2L
FET N-Channel 55V 2.8A; Manufacturer: Infineon; Package: SOT223; EDM-PN: *; Text2: *; Text1: *; Value: BSP615S2L; Part Number: BSP615S2L; SAAB PN: *; DCE Part No: *
footprint SOT223 (SOT223, 4-Leads, Body 6.7x7.3mm (max), Pitch 2.30mm, IPC Medium Density)
pins: 1 G, 2 D, 3 S, 4 D

## BSS63_SOT23
designator Q?, comment BSS63
Transistor PNP General Purpose Amplifier; Manufacturer: NXP/Fairchild; Package: SOT23; EDM-PN: *; Text2: *; Text1: *; Value: BSS63; SAAB PN: *; Part Number: BSS63; DCE Part No: *
footprint SOT23 (SOT23, 3-Leads, Body 3.0x1.4mm (max), Pitch 0.95mm, IPC Medium Density)
pins: 1 B, 2 E, 3 C

## BSS84-7-F_SOT23
designator Q?, comment BSS84-7-F
FET P-Channel; Manufacturer: Diodes Inc; EDM-PN: FET6; Package: SOT23; Text2: *; Text1: *; Value: BSS84-7-F; SAAB PN: *; Part Number: BSS84-7-F; DCE Part No: *
footprint SOT23 (SOT23, 3-Leads, Body 3.0x1.4mm (max), Pitch 0.95mm, IPC Medium Density)
pins: 1 G, 2 S, 3 D

## BSS84_SOT23
designator Q?, comment BSS84
FET P-Channel; Manufacturer: Philips; EDM-PN: FET6; Package: SOT23; Text2: *; Text1: *; Value: BSS84; SAAB PN: *; Part Number: BSS84; DCE Part No: *
footprint SOT23 (SOT23, 3-Leads, Body 3.0x1.4mm (max), Pitch 0.95mm, IPC Medium Density)
pins: 1 G, 2 S, 3 D

## BSS84PH6433XTMA1_SOT23
designator Q?, comment BSS84PH6433XTMA1
FET P-Channel 60V 170mA; Manufacturer: Infineon; Package: SOT23; EDM-PN: *; Text2: *; Text1: *; Value: BSS84PH6433XTMA1; SAAB PN: *; Part Number: BSS84PH6433XTMA1; DCE Part No: *
footprint SOT23 (SOT23, 3-Leads, Body 3.0x1.4mm (max), Pitch 0.95mm, IPC Medium Density)
pins: 1 G, 2 S, 3 D

## BSS84W-7-F_SOT323
designator Q?, comment BSS84W-7-F
FET P-Channel 50V 130mA; Manufacturer: Diodes; Package: SOT323; EDM-PN: *; Text2: *; Text1: *; Value: BSS84W-7-F; SAAB PN: *; Part Number: BSS84W-7-F; DCE Part No: *
footprint SOT323-L (SOT323 2.2x1.3mm)
pins: 1 G, 2 S, 3 D

## BSS84W-7-F_SOT323-DNF
designator Q?, comment value (BSS84W-7-F)  (hidden comment: BSS84W-7-F-DNF)
FET P-Channel 50V 130mA - Do not Fit; Manufacturer: Diodes; Part Number: DNF - BSS84W-7-F; Package: SOT323; EDM-PN: *; Text2: *; Text1: *; SAAB PN: *; DCE Part No: *
footprint SOT323-L (SOT323 2.2x1.3mm)
pins: 1 G, 2 S, 3 D

## BSS84WQ-7-F_SOT323
designator Q?, comment BSS84WQ-7-F
FET P-Channel 50V 130mA; Manufacturer: Diodes; Package: SOT323; EDM-PN: *; Text2: *; Text1: *; Value: BSS84WQ-7-F; SAAB PN: *; Part Number: BSS84WQ-7-F; DCE Part No: *
footprint SOT323-L (SOT323 2.2x1.3mm)
pins: 1 G, 2 S, 3 D

## BSS123_SOT23
designator Q?, comment BSS123
FET N-Channel 100V 170mA; Manufacturer: Fairchild; Package: SOT23; EDM-PN: *; Text2: *; Text1: *; Value: BSS123; SAAB PN: *; Part Number: BSS123; DCE Part No: *
footprint SOT23 (SOT23, 3-Leads, Body 3.0x1.4mm (max), Pitch 0.95mm, IPC Medium Density)
pins: 1 G, 2 S, 3 D

## BSS123W-7-F_SOT323
designator Q?, comment BSS123W-7-F
FET N-Channel 100V 170mA; Manufacturer: Diodes; Package: SOT323; EDM-PN: *; Text2: *; Text1: *; Value: BSS123W-7-F; SAAB PN: *; Part Number: BSS123W-7-F; DCE Part No: *
footprint SOT323 (SOT323 2.2x1.3mm)
pins: 1 G, 2 S, 3 D

## BSS126_SOT23
designator Q?, comment BSS126
FET N-Channel 600V 50mA; Manufacturer: Infineon; Package: SOT23; EDM-PN: *; Text2: *; Text1: *; Value: BSS126; SAAB PN: *; Part Number: BSS126; DCE Part No: *
footprint SOT23 (SOT23, 3-Leads, Body 3.0x1.4mm (max), Pitch 0.95mm, IPC Medium Density)
pins: 1 G, 2 S, 3 D

## BSS127S-7_SOT23
designator Q?, comment BSS127S-7
FET N-Channel 600V 50mA; Manufacturer: Diodes; Package: SOT23; EDM-PN: *; Text2: *; Text1: *; Value: BSS127S-7; SAAB PN: *; Part Number: BSS127S-7; DCE Part No: *
footprint SOT23 (SOT23, 3-Leads, Body 3.0x1.4mm (max), Pitch 0.95mm, IPC Medium Density)
pins: 1 G, 2 S, 3 D

## BSS138_SOT23
designator Q?, comment Part Number: BSS126  (hidden comment: BSS138)
FET N-Channel 50V 220mA; Manufacturer: Infineon; Value: BSS126; Package: SOT23; EDM-PN: *; Text2: *; Text1: *; SAAB PN: *; DCE Part No: *
footprint SOT23 (SOT23, 3-Leads, Body 3.0x1.4mm (max), Pitch 0.95mm, IPC Medium Density)
pins: 1 G, 2 S, 3 D

## BSS225_SOT89
designator Q?, comment BSS225
Transistor NPN 600V 90mA; Manufacturer: Infineon; Package: SOT89; EDM-PN: *; Text2: *; Text1: *; Value: BSS225; SAAB PN: *; Part Number: BSS225; DCE Part No: *
footprint SOT89 (SOT89 4.5x2.45mm)
pins: 1 B, 2 C, 3 E
text: D; G; S

## BSS308PEH6327XTSA1_SOT23
designator Q?, comment value BSS308PE  (hidden comment: BSS308PEH6327XTSA1)
FET P-Channel 30V 2A; Manufacturer: Infineon; Package: SOT23; EDM-PN: *; Text2: *; Text1: *; SAAB PN: *; Part Number: BSS308PEH6327XTSA1; DCE Part No: *
footprint SOT23 (SOT23, 3-Leads, Body 3.0x1.4mm (max), Pitch 0.95mm, IPC Medium Density)
pins: 1 G, 2 S, 3 D

## BSS316N_SOT23
designator Q?, comment BSS316N
FET N-Channel OptiMOS 2 Small-Signal 30V 1.4A; Manufacturer: Infineon; Package: SOT23; EDM-PN: *; Text2: *; Text1: *; Value: BSS316N; SAAB PN: *; Part Number: BSS316N; DCE Part No: *
footprint SOT23 (SOT23, 3-Leads, Body 3.0x1.4mm (max), Pitch 0.95mm, IPC Medium Density)
pins: 1 G, 2 S, 3 D

## BSZ033NE2LS5ATMA1_TSDSON-8
designator Q?, comment Text1: BSZ033NE  Text2: 2LS5ATMA1  (hidden comment: BSZ033NE2LS5ATMA1)
FET N-Channel 25V 18A; Manufacturer: Infineon; Package: PG-TSDSON-8-FL; EDM-PN: *; SAAB PN: *; Part Number: BSZ033NE2LS5ATMA1; Value: BSZ033NE2LS5ATMA1; DCE Part No: *
footprint PG-TSDSON-8-FL (PG-TSDSON-8-FL 3.3x3.3mm)
pins: 1-3 S, 4 G, 5-8 D

## BSZ100N06LS3GATMA1_TSDSON-8
designator Q?, comment Text1: BSZ100N06  Text2: LS3GATMA1  (hidden comment: BSZ033NE2BSZ100N06LS3GATMA1LS5ATMA1)
FET N-Channel 25V 18A; Manufacturer: Infineon; Package: PG-TSDSON-8-FL; EDM-PN: *; SAAB PN: *; Part Number: BSZ100N06LS3GATMA1; Value: BSZ100N06LS3GATMA1; DCE Part No: *
footprint PG-TSDSON-8-5-8 (PG-TSDSON-8 3.3x3.3mm)
pins: 1 S, 2 S, 3 S, 4 G, 5-8 D

## BT148W-600R_SOT223_H
designator SCR?, comment BT148W-600R
SCR 1Amp 600V; Manufacturer: NXP; Package: SOT223; EDM-PN: *; Text2: *; Text1: *; Value: BT148W-600R; SAAB PN: *; Part Number: BT148W-600R; DCE Part No: *
footprint SOT223 (SOT223, 4-Leads, Body 6.7x7.3mm (max), Pitch 2.30mm, IPC Medium Density)
pins: 1 K, 2 A, 3 G, 4 A

## BT148W-600R_SOT223_V
designator SCR?, comment BT148W-600R
SCR 1Amp 600V; Manufacturer: NXP; Package: SOT223; EDM-PN: *; Text2: *; Text1: *; Value: BT148W-600R; SAAB PN: *; Part Number: BT148W-600R; DCE Part No: *
footprint SOT223 (SOT223, 4-Leads, Body 6.7x7.3mm (max), Pitch 2.30mm, IPC Medium Density)
pins: 1 K, 2 A, 3 G, 4 A

## BT151S-650R_DPAK_H
designator SCR?, comment BT151S-650R
SCR 7.5Amp 650V; Manufacturer: NXP; EDM-PN: TRS6; Package: D-PAK; Text2: *; Text1: *; Value: BT151S-650R; SAAB PN: *; Part Number: BT151S-650R; DCE Part No: *
footprint D-PAK (D-Pak 6.73x6.22mm)
pins: 1 K, 2 A, 3 G

## BT151S-650R_DPAK_V
designator SCR?, comment BT151S-650R
SCR 7.5Amp 650V; Manufacturer: NXP; EDM-PN: TRS6; Package: D-PAK; Text2: *; Text1: *; Value: BT151S-650R; SAAB PN: *; Part Number: BT151S-650R; DCE Part No: *
footprint D-PAK (D-Pak 6.73x6.22mm)
pins: 1 K, 2 A, 3 G

## C3M0065090J_D2PAK-7
designator Q?, comment C3M0065090J
FET N-Channel Silicon Carbide Power MOSFET; Manufacturer: Cree; Package: D2PAK-7; EDM-PN: *; Text2: *; Text1: *; Value: C3M0065090J; Reutech PN: *; SAAB PN: *; DCE Part No: *; Part Number: C3M0065090J
footprint D2PAK-7L (D2PAK-7L 7 Pin 10.16x14.35mm)
pins: 1 G, 2 DS, 3 S, 4 S, 5 S, 6 S, 7 S, 8 D

## CMPT3904E TR PBFREE_SOT23
designator Q?, comment value CMPT3904E  (hidden comment: CMPT3904E TR PBFREE)
Transistor NPN 40V 200mA; Manufacturer: Central Semi; Package: SOT23; EDM-PN: *; Text2: *; Text1: *; SAAB PN: *; Part Number: CMPT3904E TR PBFREE; DCE Part No: *
footprint SOT23 (SOT23, 3-Leads, Body 3.0x1.4mm (max), Pitch 0.95mm, IPC Medium Density)
pins: 1 B, 2 E, 3 C

## CMPTA46 TR PBFREE_SOT23
designator Q?, comment value CMPTA46  (hidden comment: CMPTA46 TR PBFREE)
Transistor NPN 450V 500mA; Manufacturer: Central Semi; DCE Part No: 7812; Package: SOT23; EDM-PN: *; Text2: *; Text1: *; SAAB PN: *; Part Number: CMPTA46 TR PBFREE
footprint SOT23 (SOT23, 3-Leads, Body 3.0x1.4mm (max), Pitch 0.95mm, IPC Medium Density)
pins: 1 B, 2 E, 3 C

## CMPTA96 TR PBFREE_SOT23
designator Q?, comment value CMPTA96  (hidden comment: CMPTA96 TR PBFREE)
Transistor PNP 450V 500mA; Manufacturer: Sentral Semi; DCE Part No: 7813; Package: SOT23; EDM-PN: *; Text2: *; Text1: *; SAAB PN: *; Part Number: CMPTA96 TR PBFREE
footprint SOT23 (SOT23, 3-Leads, Body 3.0x1.4mm (max), Pitch 0.95mm, IPC Medium Density)
pins: 1 B, 2 E, 3 C

## CSD16414Q5_SON8
designator Q?, comment CSD16414Q5
FET N-Channel 34A 25V; Manufacturer: Texas; Package: SON8-6x5-EP; EDM-PN: *; Text2: *; Text1: *; Value: CSD16414Q5; SAAB PN: *; Part Number: CSD16414Q5; DCE Part No: *
footprint SON8-5x6-EP (SON 8 6.1x5.1mm)
pins: 1 S, 2 S, 3 S, 4 G, 5 D, 6 D, 7 D, 8 D, 9 D